# Altium footprint library ic.PcbLib: 129 footprints (part 9 of 9)
Each footprint in its own frame and in the unit in brackets; x right, y up, seen from the top. Pads: shape width x height; smd on the part's side, far side on the other; paste and mask are expansions set on the pad; w line width, h text height; cw(c..) or ccw(c..) is an arc to the next point about the centre after c.
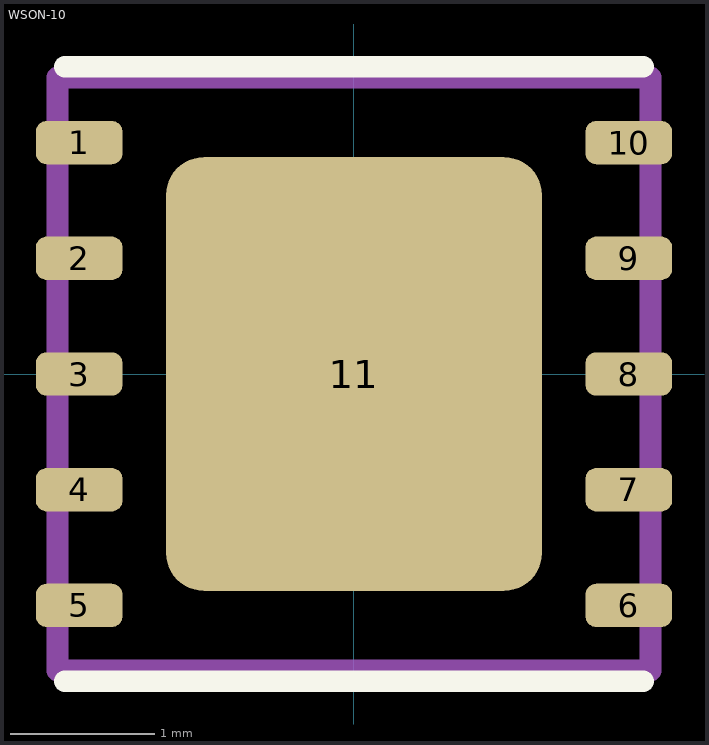
[diagram p8: the footprint, top view; thin cyan lines are the x and y axes]

## WSON-10 [mm] "WSON, 10-Leads, Body 4,00x4,00mm, Pitch 0,80mm, Thermal Pad 3,00x2,60mm, IPC High Density"
height 0.8
pads (11):
  rrect50% 0.6x0.3 smd: 1(-1.9,1.6) 2(-1.9,0.8) 3(-1.9,0) 4(-1.9,-0.8) 5(-1.9,-1.6) 6(1.9,-1.6) 7(1.9,-0.8) 8(1.9,0) 9(1.9,0.8) 10(1.9,1.6)
  rrect20% 2.6x3 smd paste-1.3: 11(0,0)
Top Overlay:
  lines w0.15: -2,-2.125 1.635,-2.125 2,-2.125 ; -2,2.125 1.635,2.125 2,2.125
  text "." at -2.455,2.159 h0.1
Top Courtyard:
  lines w0.15: -2.05,-2.05 -2.05,2.05 2.05,2.05 2.05,-2.05 -2.05,-2.05
3D body "WSON-10.step": height 0.8, standoff 0, extent -2.001,-2 2.001,2